# Altium footprint library SOT SOD TO DAPK.PcbLib: 156 footprints (part 6 of 10)
Each footprint in its own frame and in the unit in brackets; x right, y up, seen from the top. Pads: shape width x height; smd on the part's side, far side on the other; paste and mask are expansions set on the pad; w line width, h text height; cw(c..) or ccw(c..) is an arc to the next point about the centre after c.
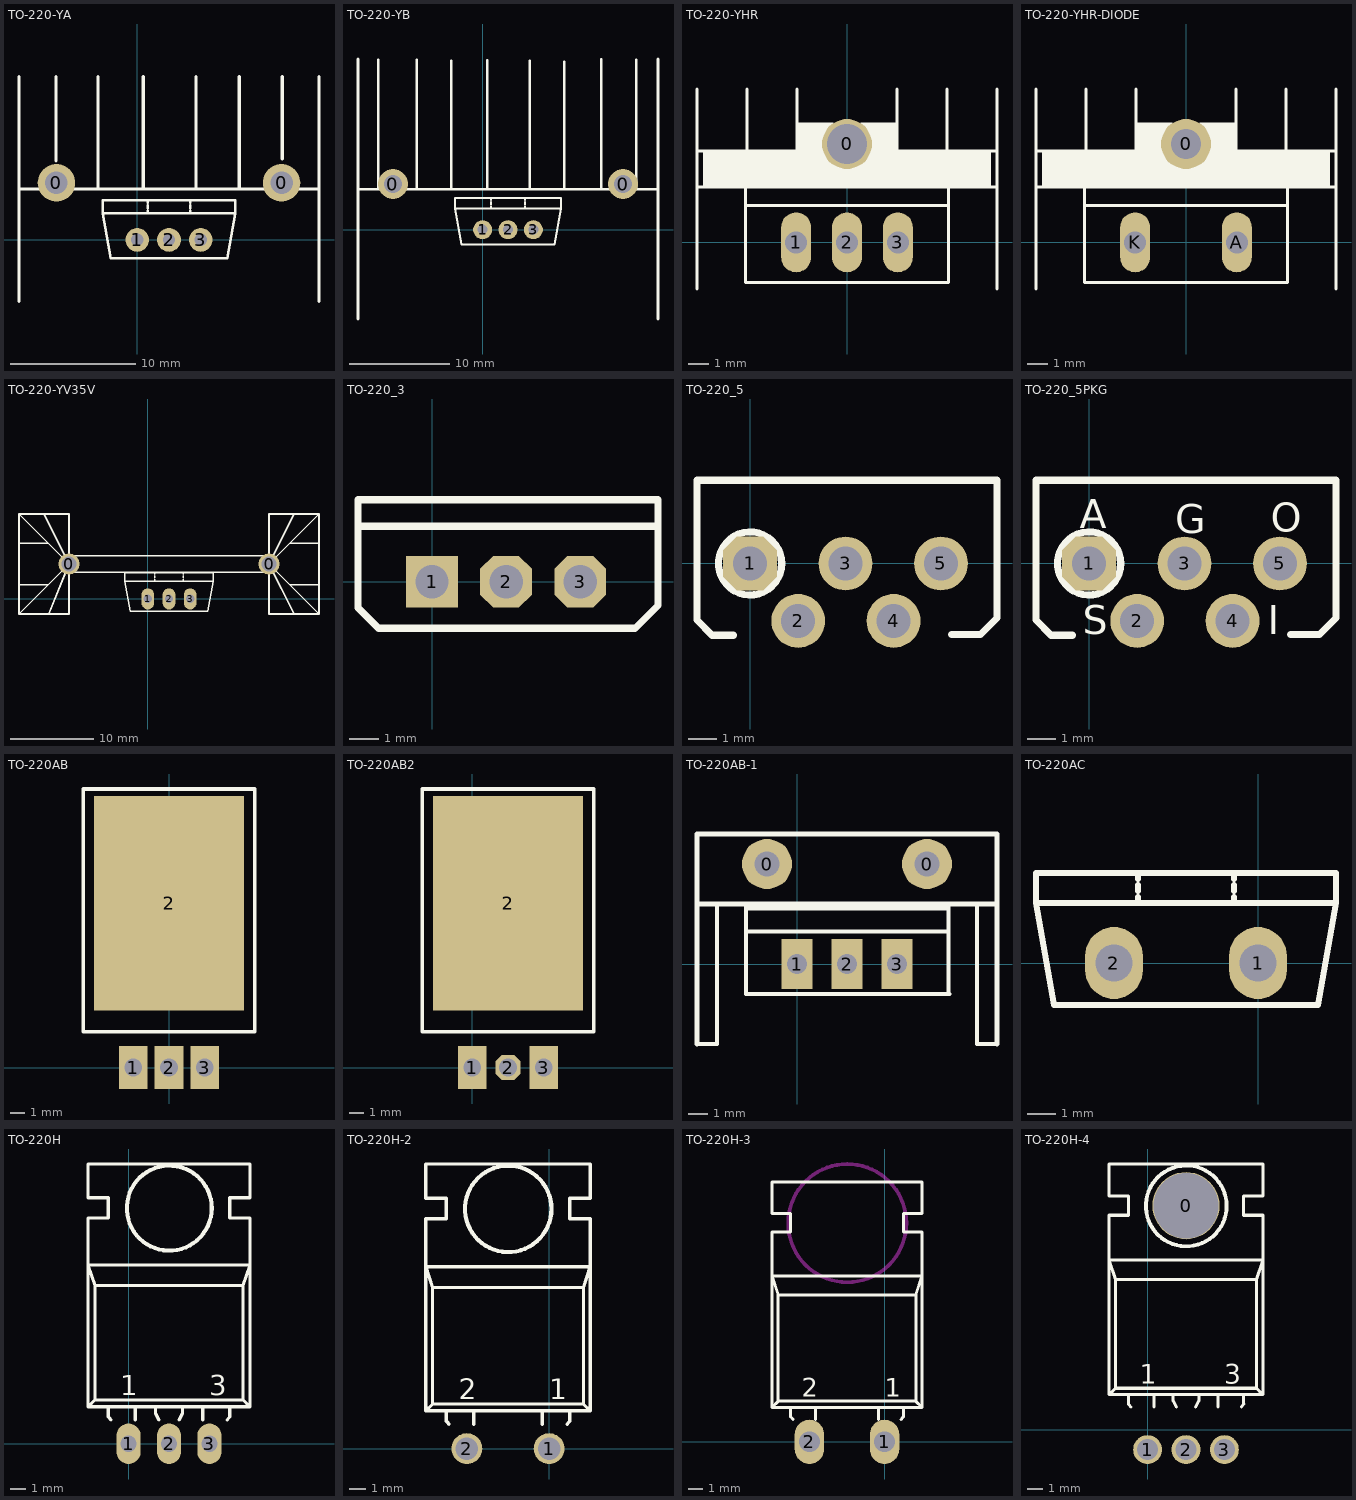
[diagram p5: the footprints below, top view; thin cyan lines are the x and y axes]

## TO-220-YA [mm]
pads (5):
  round 3 hole 1.8: 0(-6.46,4.564) 0(11.54,4.564)
  round 1.9 hole 1: 1(0,0) 2(2.54,0) 3(5.08,0)
Top Overlay:
  lines w0.2: 0.847,2.117 0.847,2.328 ; 0.847,2.54 0.847,2.752 ; 0.847,2.963 0.847,3.175 ; 4.233,2.117 4.233,2.328 ; 4.233,2.54 4.233,2.752 ; 4.233,2.963 4.233,3.175 ; -2.752,2.117 -2.752,3.175 7.832,3.175 7.832,2.117 ; -2.752,2.117 -2.117,-1.482 7.197,-1.482 7.832,2.117 ; -2.752,2.117 7.832,2.117
  lines w0.254: -9.46,-4.929 -9.46,13.071 ; -9.46,4.064 14.54,4.064 ; -6.488,6.33 -6.488,13.071 ; -3.138,4.208 -3.138,13.071 ; 0.48,4.064 0.48,13.071 ; 4.701,4.099 4.701,13.071 ; 8.155,4.208 8.155,13.071 ; 11.601,6.473 11.601,13.071 ; 14.54,-4.929 14.54,13.071
3D body: height 35, standoff 0.5, extent -10.414,-4.953 14.605,13.081
3D body "User Library-TO220-AB PCB.STEP": height 20.05, standoff -3.5, extent -2.41,-1.296 7.49,3.161

## TO-220-YB [mm]
pads (5):
  round 3 hole 1.8: 0(-8.96,4.564) 0(14.04,4.564)
  round 1.9 hole 1: 1(0,0) 2(2.54,0) 3(5.08,0)
Top Overlay:
  lines w0.2: 0.847,2.117 0.847,2.328 ; 0.847,2.54 0.847,2.752 ; 0.847,2.963 0.847,3.175 ; 4.233,2.117 4.233,2.328 ; 4.233,2.54 4.233,2.752 ; 4.233,2.963 4.233,3.175 ; -2.752,2.117 -2.752,3.175 7.832,3.175 7.832,2.117 ; -2.752,2.117 -2.117,-1.482 7.197,-1.482 7.832,2.117 ; -2.752,2.117 7.832,2.117
  lines w0.254: -12.46,-8.929 -12.46,17.071 ; -12.46,4.064 17.54,4.064 ; -10.429,4.263 -10.429,16.982 ; -6.592,4.064 -6.592,16.981 ; -3.138,4.208 -3.138,16.873 ; 0.48,4.064 0.48,16.926 ; 4.701,4.099 4.701,16.872 ; 8.155,4.208 8.155,16.816 ; 11.882,4.208 11.882,17.036 ; 15.364,4.064 15.364,17.009 ; 17.54,-8.929 17.54,17.071
3D body: height 35, standoff 0.5, extent -12.446,-9.017 17.907,17.018
3D body "User Library-TO220-AB PCB.STEP": height 20.05, standoff -3.5, extent -2.537,-1.423 7.363,3.034

## TO-220-YHR [mm]
pads (4):
  round 2.5 hole 2: 0(0,4.917)
  oval 1.5x3 hole 1.1: 1(-2.54,0) 2(0,0) 3(2.54,0)
Top Overlay:
  region: 2.5,5.994 0.667,5.994 0.667,4.039 2.5,4.039
  rectangle: -2.5,4.039 -0.667,5.994
  rectangle: -7.195,2.767 7.207,4.567
  lines w0.15: -7.5,-2.333 -7.5,7.667 ; -7.5,2.767 7.5,2.767 ; -7.5,4.567 7.5,4.567 ; -5.08,1.848 5.08,1.848 ; -5,4.567 -5,7.667 ; -2.5,4.567 -2.5,7.667 ; 2.5,4.567 2.5,7.667 ; 5,4.567 5,7.667 ; 7.5,-2.333 7.5,7.667 ; -5.08,-2 -5.08,2.79 5.08,2.79 5.08,-2 -5.08,-2
3D body "User Library-heatsink TO126.step": height 25, standoff -3.8, extent -8.153,-1.784 6.629,9.017
3D body "User Library-TO220-AB PCB.STEP": height 20.05, standoff -3.5, extent -4.95,-2.439 4.95,2.018

## TO-220-YHR-DIODE [mm]
pads (3):
  round 2.5 hole 1.5: 0(0,4.917)
  oval 1.5x3 hole 1.1: A(2.54,0) K(-2.54,0)
Top Overlay:
  region: 2.5,5.994 0.667,5.994 0.667,4.039 2.5,4.039
  rectangle: -2.5,4.039 -0.667,5.994
  rectangle: -7.195,2.767 7.207,4.567
  lines w0.15: -7.5,-2.333 -7.5,7.667 ; -7.5,2.767 7.5,2.767 ; -7.5,4.567 7.5,4.567 ; -5.08,1.848 5.08,1.848 ; -5,4.567 -5,7.667 ; -2.5,4.567 -2.5,7.667 ; 2.5,4.567 2.5,7.667 ; 5,4.567 5,7.667 ; 7.5,-2.333 7.5,7.667 ; -5.08,-2 5.08,-2 5.08,2.79 -5.08,2.79 -5.08,-2
3D body "User Library-heatsink TO126.step": height 25, standoff -3.8, extent -7.391,-2.578 7.391,8.223

## TO-220-YV35V [mil]
pads (5):
  round 100 hole 70: 0(-372.44,165) 0(572.44,165)
  oval 60x100 hole 40: 1(0,0) 2(100,0) 3(200,0)
Top Overlay:
  lines w7.87: 33.33,83.33 33.33,91.67 ; 33.33,100 33.33,108.33 ; 33.33,116.67 33.33,125 ; 166.67,83.33 166.67,91.67 ; 166.67,100 166.67,108.33 ; 166.67,116.67 166.67,125 ; -108.33,83.33 308.33,83.33 ; -108.33,83.33 -83.33,-58.33 283.33,-58.33 308.33,83.33 ; -108.33,83.33 -108.33,125 308.33,125 308.33,83.33
  lines w8: -608.66,67 -471.56,67 ; -608.56,263.43 -470.56,263.43 ; -490.55,401.22 -372.44,165 ; -467.56,-71.22 -372.44,165 ; -372.44,125.63 572.44,125.63 ; -372.44,204.37 572.44,204.37 ; 670.87,263.43 808.66,263.43 ; 671.87,67 808.66,67 ; 690.55,401.22 572.44,165 ; 692.44,-71.22 572.44,165 ; -608.66,-71.22 -372.44,-71.22 -372.44,401.22 -608.66,401.22 ; -608.66,-71.22 -372.44,165 ; -608.66,-71.22 -608.66,401.22 ; -608.66,401.22 -372.44,165 ; 572.44,165 808.66,-71.22 ; 572.44,165 808.66,401.22 ; 808.66,-71.22 572.44,-71.22 572.44,401.22 808.66,401.22 ; 808.66,-71.22 808.66,401.22
3D body: height 728.23, standoff 610.35, extent 40,-67.48 157.65,247.48
3D body: height 1968.5, standoff 19.68, extent -605,-70 805,400
3D body "User Library-TO220-AB PCB.STEP": height 789.37, standoff -137.8, extent -99.88,-46.02 289.88,129.47

## TO-220_3 [mil]
pads (3):
  rect 70x70 hole 45: 1(0,0)
  oct 70x70 hole 45: 2(100,0) 3(200,0)
Top Overlay:
  lines w10: -94,75 302,75 ; -100,-35 -100,111 305,111 305,-32 274,-63 -72,-63 -100,-35
3D body "TO220_3.STEP": height 728.35, standoff -389.76, extent -104.45,-72.17 305,105

## TO-220_5 [mil]
pads (5):
  oct 75x75 hole 47.24: 1(0,0)
  round 75 hole 47.24: 2(67,-80) 3(133,0) 4(200,-80) 5(266,0)
Top Overlay:
  circle w10: c0,0 r44
  lines w10: -23,-100 -53,-100 -74.02,-78.98 -74.02,52.76 -74.02,116 344.09,116 344.09,56.38 344.09,-75.91 320.91,-99.09 280.91,-99.09
3D body "TO220-5.STEP": height 761.81, standoff -89.06, extent -66.14,-82.69 333.86,110.24

## TO-220_5PKG [mil]
pads (5):
  oct 75x75 hole 47.24: 1(0,0)
  round 75 hole 47.24: 2(67,-80) 3(133,0) 4(200,-80) 5(266,0)
Top Overlay:
  circle w10: c0,0 r44
  lines w10: -23,-100 -53,-100 -74.02,-78.98 -74.02,52.76 -74.02,116 344.09,116 344.09,56.38 344.09,-75.91 320.91,-99.09 280.91,-99.09
  text "O" at 253,44 h40
  text "G" at 120,42 h40
  text "I" at 249,-99 h40
  text "S" at -9,-99 h40
  text "A" at -13,49 h40
3D body "TO220-5.STEP": height 761.81, standoff -89.06, extent -66.14,-82.69 333.86,110.24

## TO-220AB [mil]
pads (4):
  rect 80x120 hole 50: 1(-100,0) 2(0,0) 3(100,0)
  rect 420x600 smd: 2(0,460)
Top Overlay:
  lines w10: -240,100 240,100 240,780 -240,780 -240,100
3D body "User Library-TO220 L.STEP": height 177.17, standoff -118.11, extent -195,-27.88 198.7,747.88

## TO-220AB2 [mil]
pads (4):
  rect 80x120 hole 50: 1(0,0) 3(200,0)
  oct 70x70 hole 50: 2(100,0)
  rect 420x600 smd: 2(100,460)
Top Overlay:
  lines w10: -140,100 -140,780 340,780 340,100 -140,100
3D body "User Library-TO220 L.STEP": height 177.17, standoff -118.11, extent -101.85,-5 291.85,770.76

## TO-220AB-1 [mil]
pads (5):
  round 100 hole 50: 0(-60,200) 0(260,200)
  rect 62x100 hole 40: 1(0,0) 2(100,0) 3(200,0)
Top Overlay:
  lines w8: -200,-160 -160,-160 -160,120 ; -102.5,-60 -102.5,113 ; -102.5,65 302.5,65 ; -100,-60 305,-60 ; 302.5,-60 302.5,113 ; 360,120 360,-160 400,-160
  lines w10: -200,-160 -200,260 400,260 400,-160 ; -200,120 400,120
  lines w12: -99,113 299,113
3D body: height 78.74, standoff 0, extent 255.47,195.36 294.69,234.64
3D body: height 78.74, standoff 0, extent -79.53,180.35 -40.31,219.65
3D body: height 787.4, standoff 19.68, extent -200,-160 400,260
3D body "User Library-TO220-AB PCB.STEP": height 789.37, standoff -137.8, extent -99.88,-71.02 289.88,104.47

## TO-220AC [mil]
pads (2):
  oval 80x100 hole 51.18: 1(0,0) 2(-200,0)
Top Overlay:
  lines w7.87: -166.67,83.33 -166.67,91.67 ; -166.67,100 -166.67,108.33 ; -166.67,116.67 -166.67,125 ; -33.33,83.33 -33.33,91.67 ; -33.33,100 -33.33,108.33 ; -33.33,116.67 -33.33,125 ; -308.33,83.33 -308.33,125 108.33,125 108.33,83.33 ; -308.33,83.33 -283.33,-58.33 83.33,-58.33 108.33,83.33 ; -308.33,83.33 108.33,83.33
3D body "IC2.STEP": height 767.72, standoff -157.48, extent -306.69,-56.97 106.69,128.07

## TO-220H [mil]
pads (3):
  oval 60x100 hole 40: 1(0,0) 2(100,0) 3(200,0)
Top Overlay:
  circle w10: c100.67,582.53 r105
  lines w7.87: -50,66.67 -50,91.67 ; -48.11,65.41 -43.58,59.05 ; 16.67,59.05 16.67,91.67 ; 66.67,91.67 66.67,75 75,59.05 ; 125,59.05 133.33,75 133.33,91.67 ; 183.33,59.05 183.33,91.67 ; 243.9,59.05 250.31,67.61 ; 250,66.67 250,91.67 ; -100,91.67 -100,558.33 -50,558.33 -50,608.33 -100,608.33 -100,691.67 300,691.67 300,608.33 250,608.33 250,558.33 300,558.33 300,91.67 ; -100,91.67 300,91.67 ; -100,91.67 -83.33,108.33 ; -83.33,108.33 -83.33,391.67 ; -83.33,108.33 283.33,108.33 ; -83.33,391.67 -100,441.67 300,441.67 283.33,391.67 ; -83.33,391.67 283.33,391.67 ; 283.33,108.33 283.33,391.67 ; 283.33,108.33 300,91.67
  text "3" at 200,120 h50
  text "1" at -20,120 h50
3D body "User Library-TO220 L.STEP": height 177.17, standoff -118.11, extent -100,-27.88 293.7,747.88

## TO-220H-2 [mil]
pads (2):
  round 75 hole 55: 1(0,0) 2(-200,0)
Top Overlay:
  circle w10: c-99.33,582.53 r105
  lines w7.87: -250,66.67 -250,91.67 ; -248.11,65.41 -243.58,59.05 ; -183.33,59.05 -183.33,91.67 ; -16.67,59.05 -16.67,91.67 ; 43.9,59.05 50.31,67.61 ; 50,66.67 50,91.67 ; -300,91.67 -283.33,108.33 ; -300,91.67 100,91.67 ; -300,91.67 -300,558.33 -250,558.33 -250,608.33 -300,608.33 -300,691.67 100,691.67 100,608.33 50,608.33 50,558.33 100,558.33 100,91.67 ; -283.33,108.33 83.33,108.33 ; -283.33,108.33 -283.33,391.67 ; -283.33,391.67 83.33,391.67 ; -283.33,391.67 -300,441.67 100,441.67 83.33,391.67 ; 83.33,108.33 100,91.67 ; 83.33,108.33 83.33,391.67
  text "2" at -220,120 h50
  text "1" at 0,120 h50
3D body "User Library-TO220 L.STEP": height 177.17, standoff -118.11, extent -293.7,-12.88 100,762.88

## TO-220H-3 [mm]
pads (2):
  oval 2x3 hole 1.4: 1(0,0) 2(-5.08,0)
Top Overlay:
  lines w0.2: -6.35,1.693 -6.35,2.328 ; -6.302,1.661 -6.187,1.5 ; -4.657,1.5 -4.657,2.328 ; -0.423,1.5 -0.423,2.328 ; 1.115,1.5 1.278,1.717 ; 1.27,1.693 1.27,2.328 ; -7.62,2.328 -7.197,2.752 ; -7.62,2.328 2.54,2.328 ; -7.62,2.328 -7.62,14.182 -6.35,14.182 -6.35,15.452 -7.62,15.452 -7.62,17.568 2.54,17.568 2.54,15.452 1.27,15.452 1.27,14.182 2.54,14.182 2.54,2.328 ; -7.197,2.752 2.117,2.752 ; -7.197,2.752 -7.197,9.948 ; -7.197,9.948 2.117,9.948 ; -7.197,9.948 -7.62,11.218 2.54,11.218 2.117,9.948 ; 2.117,2.752 2.54,2.328 ; 2.117,2.752 2.117,9.948
  text "2" at -5.588,3.048 h1.27
  text "1" at 0,3.048 h1.27
Keep-Out Layer:
  circle w0.254: c-2.523,14.796 r4
3D body "User Library-TO220 L.STEP": height 4.5, standoff -3, extent -7.493,-0.835 2.507,18.869

## TO-220H-4 [mil]
pads (4):
  round 175 hole 170: 0(100,583.33)
  round 75 hole 55: 1(0,-51.18) 2(100,-51.18) 3(200,-51.18)
Top Overlay:
  circle w10: c100.67,582.53 r105
  lines w7.87: -50,66.67 -50,91.67 ; -48.11,65.41 -43.58,59.05 ; 16.67,59.05 16.67,91.67 ; 66.67,91.67 66.67,75 75,59.05 ; 125,59.05 133.33,75 133.33,91.67 ; 183.33,59.05 183.33,91.67 ; 243.9,59.05 250.31,67.61 ; 250,66.67 250,91.67 ; -100,91.67 -83.33,108.33 ; -100,91.67 300,91.67 ; -100,91.67 -100,558.33 -50,558.33 -50,608.33 -100,608.33 -100,691.67 300,691.67 300,608.33 250,608.33 250,558.33 300,558.33 300,91.67 ; -83.33,108.33 283.33,108.33 ; -83.33,108.33 -83.33,391.67 ; -83.33,391.67 283.33,391.67 ; -83.33,391.67 -100,441.67 300,441.67 283.33,391.67 ; 283.33,108.33 300,91.67 ; 283.33,108.33 283.33,391.67
  text "1" at -20,120 h50
  text "3" at 200,120 h50
3D body "SW3DPS-TO-220-DEFAULT.step": height 165.35, standoff -118.11, extent -100,-57.6 300,709.73